# Altium schematic symbol library Regulator_Linear.SchLib: 1538 symbols (part 6 of 9) (continued)
## MCP1804x-1802xDB
designator *  value MCP1804x-1802xDB  Reference: U
ki_keywords: linear regulator ldo fixed positive; ki_description: 150mA, 28V LDO Regulator With Shutdown, 1.8V Fixed Output, SOT-223; ki_fp_filters: SOT?223*; Footprint: Package_TO_SOT_SMD:SOT-223-3_TabPin2; Datasheet: http://ww1.microchip.com/downloads/en/DeviceDoc/20002200D.pdf
pins: 1 OUT, 2 GND, 3 IN

## MCP1804x-1802xMB
designator *  value MCP1804x-1802xMB  Reference: U
ki_keywords: linear regulator ldo fixed positive; ki_description: 150mA, 28V LDO Regulator With Shutdown, 1.8V Fixed Output, SOT-89-3; ki_fp_filters: SOT?89*; Footprint: Package_TO_SOT_SMD:SOT-89-3; Datasheet: http://ww1.microchip.com/downloads/en/DeviceDoc/20002200D.pdf
pins: 1 OUT, 2 GND, 3 IN

## MCP1804x-1802xMT
designator *  value MCP1804x-1802xMT  Reference: U
ki_keywords: linear regulator ldo fixed positive; ki_description: 150mA, 28V LDO Regulator With Shutdown, 1.8V Fixed Output, SOT-89-5; ki_fp_filters: SOT?89*; Footprint: Package_TO_SOT_SMD:SOT-89-5; Datasheet: http://ww1.microchip.com/downloads/en/DeviceDoc/20002200D.pdf
pins: 1 VOUT, 2 GND, 3 ~{{SHDN}}, 4 NC hidden, 5 VIN

## MCP1804x-1802xOT
designator *  value MCP1804x-1802xOT  Reference: U
ki_keywords: linear regulator ldo fixed positive; ki_description: 150mA, 28V LDO Regulator With Shutdown, 1.8V Fixed Output, SOT-23-5; ki_fp_filters: SOT?23*; Footprint: Package_TO_SOT_SMD:SOT-23-5; Datasheet: http://ww1.microchip.com/downloads/en/DeviceDoc/20002200D.pdf
pins: 1 VIN, 2 GND, 3 NC hidden, 4 ~{{SHDN}}, 5 VOUT

## MCP1804x-2502xDB
designator *  value MCP1804x-2502xDB  Reference: U
ki_keywords: linear regulator ldo fixed positive; ki_description: 150mA, 28V LDO Regulator With Shutdown, 2.5V Fixed Output, SOT-223; ki_fp_filters: SOT?223*; Footprint: Package_TO_SOT_SMD:SOT-223-3_TabPin2; Datasheet: http://ww1.microchip.com/downloads/en/DeviceDoc/20002200D.pdf
pins: 1 OUT, 2 GND, 3 IN

## MCP1804x-2502xMB
designator *  value MCP1804x-2502xMB  Reference: U
ki_keywords: linear regulator ldo fixed positive; ki_description: 150mA, 28V LDO Regulator With Shutdown, 2.5V Fixed Output, SOT-89-3; ki_fp_filters: SOT?89*; Footprint: Package_TO_SOT_SMD:SOT-89-3; Datasheet: http://ww1.microchip.com/downloads/en/DeviceDoc/20002200D.pdf
pins: 1 OUT, 2 GND, 3 IN

## MCP1804x-2502xMT
designator *  value MCP1804x-2502xMT  Reference: U
ki_keywords: linear regulator ldo fixed positive; ki_description: 150mA, 28V LDO Regulator With Shutdown, 2.5V Fixed Output, SOT-89-5; ki_fp_filters: SOT?89*; Footprint: Package_TO_SOT_SMD:SOT-89-5; Datasheet: http://ww1.microchip.com/downloads/en/DeviceDoc/20002200D.pdf
pins: 1 VOUT, 2 GND, 3 ~{{SHDN}}, 4 NC hidden, 5 VIN

## MCP1804x-2502xOT
designator *  value MCP1804x-2502xOT  Reference: U
ki_keywords: linear regulator ldo fixed positive; ki_description: 150mA, 28V LDO Regulator With Shutdown, 2.5V Fixed Output, SOT-23-5; ki_fp_filters: SOT?23*; Footprint: Package_TO_SOT_SMD:SOT-23-5; Datasheet: http://ww1.microchip.com/downloads/en/DeviceDoc/20002200D.pdf
pins: 1 VIN, 2 GND, 3 NC hidden, 4 ~{{SHDN}}, 5 VOUT

## MCP1804x-3002xDB
designator *  value MCP1804x-3002xDB  Reference: U
ki_keywords: linear regulator ldo fixed positive; ki_description: 150mA, 28V LDO Regulator With Shutdown, 3.0V Fixed Output, SOT-223; ki_fp_filters: SOT?223*; Footprint: Package_TO_SOT_SMD:SOT-223-3_TabPin2; Datasheet: http://ww1.microchip.com/downloads/en/DeviceDoc/20002200D.pdf
pins: 1 OUT, 2 GND, 3 IN

## MCP1804x-3002xMB
designator *  value MCP1804x-3002xMB  Reference: U
ki_keywords: linear regulator ldo fixed positive; ki_description: 150mA, 28V LDO Regulator With Shutdown, 3.0V Fixed Output, SOT-89-3; ki_fp_filters: SOT?89*; Footprint: Package_TO_SOT_SMD:SOT-89-3; Datasheet: http://ww1.microchip.com/downloads/en/DeviceDoc/20002200D.pdf
pins: 1 OUT, 2 GND, 3 IN

## MCP1804x-3002xMT
designator *  value MCP1804x-3002xMT  Reference: U
ki_keywords: linear regulator ldo fixed positive; ki_description: 150mA, 28V LDO Regulator With Shutdown, 3.0V Fixed Output, SOT-89-5; ki_fp_filters: SOT?89*; Footprint: Package_TO_SOT_SMD:SOT-89-5; Datasheet: http://ww1.microchip.com/downloads/en/DeviceDoc/20002200D.pdf
pins: 1 VOUT, 2 GND, 3 ~{{SHDN}}, 4 NC hidden, 5 VIN

## MCP1804x-3002xOT
designator *  value MCP1804x-3002xOT  Reference: U
ki_keywords: linear regulator ldo fixed positive; ki_description: 150mA, 28V LDO Regulator With Shutdown, 3.0V Fixed Output, SOT-23-5; ki_fp_filters: SOT?23*; Footprint: Package_TO_SOT_SMD:SOT-23-5; Datasheet: http://ww1.microchip.com/downloads/en/DeviceDoc/20002200D.pdf
pins: 1 VIN, 2 GND, 3 NC hidden, 4 ~{{SHDN}}, 5 VOUT

## MCP1804x-3302xDB
designator *  value MCP1804x-3302xDB  Reference: U
ki_keywords: linear regulator ldo fixed positive; ki_description: 150mA, 28V LDO Regulator With Shutdown, 3.3V Fixed Output, SOT-223; ki_fp_filters: SOT?223*; Footprint: Package_TO_SOT_SMD:SOT-223-3_TabPin2; Datasheet: http://ww1.microchip.com/downloads/en/DeviceDoc/20002200D.pdf
pins: 1 OUT, 2 GND, 3 IN

## MCP1804x-3302xMB
designator *  value MCP1804x-3302xMB  Reference: U
ki_keywords: linear regulator ldo fixed positive; ki_description: 150mA, 28V LDO Regulator With Shutdown, 3.3V Fixed Output, SOT-89-3; ki_fp_filters: SOT?89*; Footprint: Package_TO_SOT_SMD:SOT-89-3; Datasheet: http://ww1.microchip.com/downloads/en/DeviceDoc/20002200D.pdf
pins: 1 OUT, 2 GND, 3 IN

## MCP1804x-3302xMT
designator *  value MCP1804x-3302xMT  Reference: U
ki_keywords: linear regulator ldo fixed positive; ki_description: 150mA, 28V LDO Regulator With Shutdown, 3.3V Fixed Output, SOT-89-5; ki_fp_filters: SOT?89*; Footprint: Package_TO_SOT_SMD:SOT-89-5; Datasheet: http://ww1.microchip.com/downloads/en/DeviceDoc/20002200D.pdf
pins: 1 VOUT, 2 GND, 3 ~{{SHDN}}, 4 NC hidden, 5 VIN

## MCP1804x-3302xOT
designator *  value MCP1804x-3302xOT  Reference: U
ki_keywords: linear regulator ldo fixed positive; ki_description: 150mA, 28V LDO Regulator With Shutdown, 3.3V Fixed Output, SOT-23-5; ki_fp_filters: SOT?23*; Footprint: Package_TO_SOT_SMD:SOT-23-5; Datasheet: http://ww1.microchip.com/downloads/en/DeviceDoc/20002200D.pdf
pins: 1 VIN, 2 GND, 3 NC hidden, 4 ~{{SHDN}}, 5 VOUT

## MCP1804x-5002xDB
designator *  value MCP1804x-5002xDB  Reference: U
ki_keywords: linear regulator ldo fixed positive; ki_description: 150mA, 28V LDO Regulator With Shutdown, 5.0V Fixed Output, SOT-223; ki_fp_filters: SOT?223*; Footprint: Package_TO_SOT_SMD:SOT-223-3_TabPin2; Datasheet: http://ww1.microchip.com/downloads/en/DeviceDoc/20002200D.pdf
pins: 1 OUT, 2 GND, 3 IN

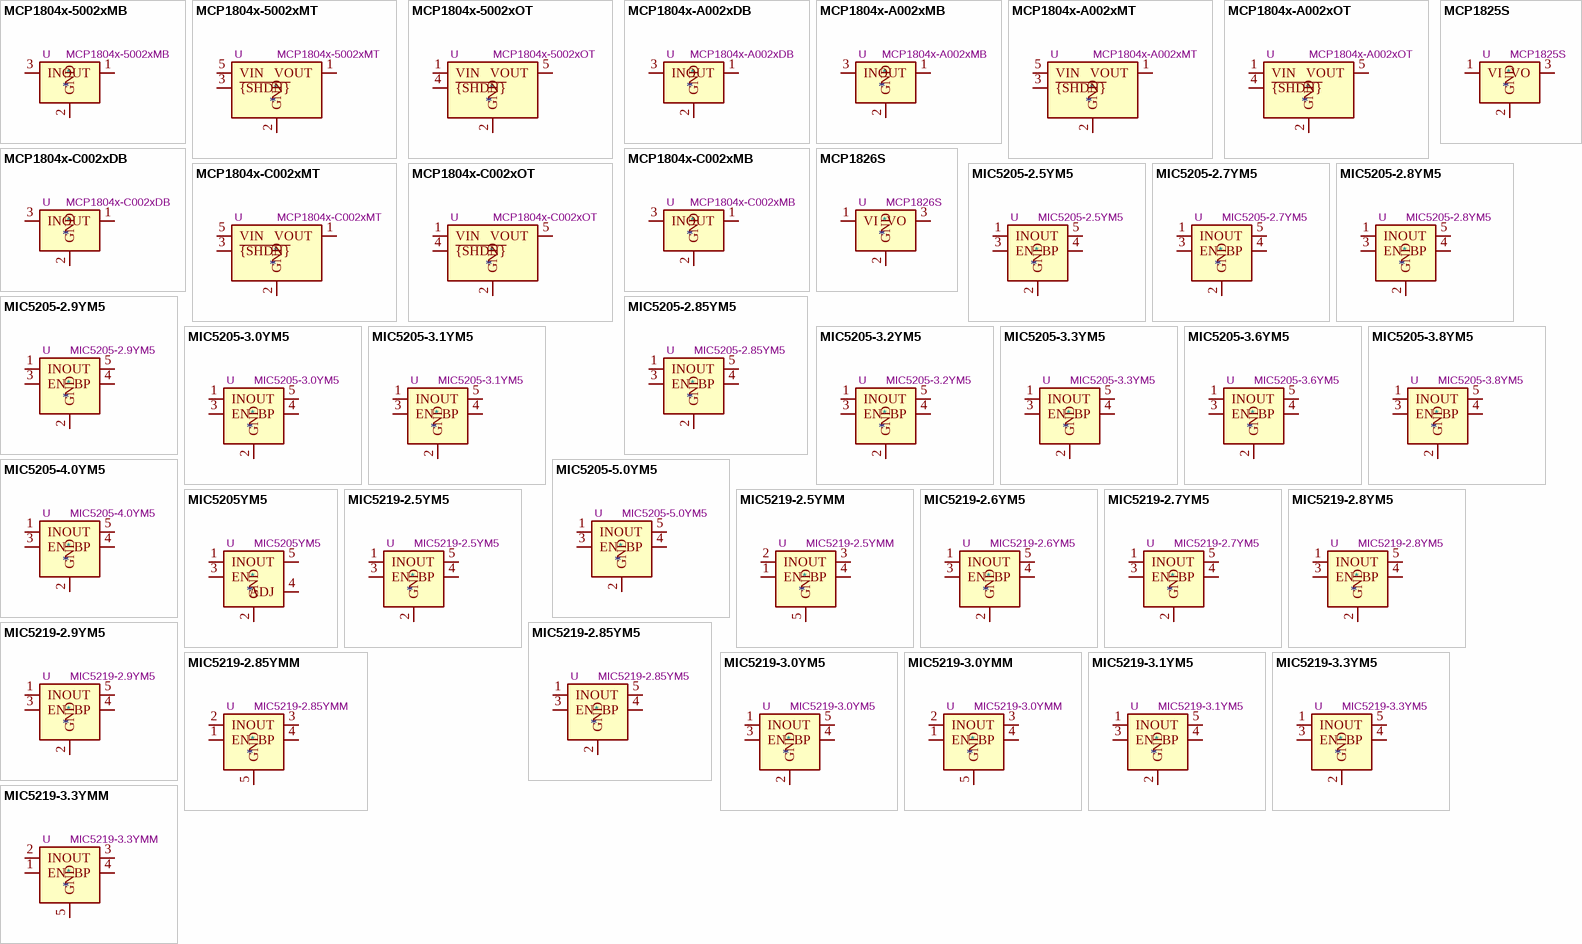
[diagram p25: symbols MCP1804x-5002xMB to MIC5219-3.3YMM]

## MCP1804x-5002xMB
designator *  value MCP1804x-5002xMB  Reference: U
ki_keywords: linear regulator ldo fixed positive; ki_description: 150mA, 28V LDO Regulator With Shutdown, 5.0V Fixed Output, SOT-89-3; ki_fp_filters: SOT?89*; Footprint: Package_TO_SOT_SMD:SOT-89-3; Datasheet: http://ww1.microchip.com/downloads/en/DeviceDoc/20002200D.pdf
pins: 1 OUT, 2 GND, 3 IN

## MCP1804x-5002xMT
designator *  value MCP1804x-5002xMT  Reference: U
ki_keywords: linear regulator ldo fixed positive; ki_description: 150mA, 28V LDO Regulator With Shutdown, 5.0V Fixed Output, SOT-89-5; ki_fp_filters: SOT?89*; Footprint: Package_TO_SOT_SMD:SOT-89-5; Datasheet: http://ww1.microchip.com/downloads/en/DeviceDoc/20002200D.pdf
pins: 1 VOUT, 2 GND, 3 ~{{SHDN}}, 4 NC hidden, 5 VIN

## MCP1804x-5002xOT
designator *  value MCP1804x-5002xOT  Reference: U
ki_keywords: linear regulator ldo fixed positive; ki_description: 150mA, 28V LDO Regulator With Shutdown, 5.0V Fixed Output, SOT-23-5; ki_fp_filters: SOT?23*; Footprint: Package_TO_SOT_SMD:SOT-23-5; Datasheet: http://ww1.microchip.com/downloads/en/DeviceDoc/20002200D.pdf
pins: 1 VIN, 2 GND, 3 NC hidden, 4 ~{{SHDN}}, 5 VOUT

## MCP1804x-A002xDB
designator *  value MCP1804x-A002xDB  Reference: U
ki_keywords: linear regulator ldo fixed positive; ki_description: 150mA, 28V LDO Regulator With Shutdown, 10.0V Fixed Output, SOT-223; ki_fp_filters: SOT?223*; Footprint: Package_TO_SOT_SMD:SOT-223-3_TabPin2; Datasheet: http://ww1.microchip.com/downloads/en/DeviceDoc/20002200D.pdf
pins: 1 OUT, 2 GND, 3 IN

## MCP1804x-A002xMB
designator *  value MCP1804x-A002xMB  Reference: U
ki_keywords: linear regulator ldo fixed positive; ki_description: 150mA, 28V LDO Regulator With Shutdown, 10.0V Fixed Output, SOT-89-3; ki_fp_filters: SOT?89*; Footprint: Package_TO_SOT_SMD:SOT-89-3; Datasheet: http://ww1.microchip.com/downloads/en/DeviceDoc/20002200D.pdf
pins: 1 OUT, 2 GND, 3 IN

## MCP1804x-A002xMT
designator *  value MCP1804x-A002xMT  Reference: U
ki_keywords: linear regulator ldo fixed positive; ki_description: 150mA, 28V LDO Regulator With Shutdown, 10.0V Fixed Output, SOT-89-5; ki_fp_filters: SOT?89*; Footprint: Package_TO_SOT_SMD:SOT-89-5; Datasheet: http://ww1.microchip.com/downloads/en/DeviceDoc/20002200D.pdf
pins: 1 VOUT, 2 GND, 3 ~{{SHDN}}, 4 NC hidden, 5 VIN

## MCP1804x-A002xOT
designator *  value MCP1804x-A002xOT  Reference: U
ki_keywords: linear regulator ldo fixed positive; ki_description: 150mA, 28V LDO Regulator With Shutdown, 10.0V Fixed Output, SOT-23-5; ki_fp_filters: SOT?23*; Footprint: Package_TO_SOT_SMD:SOT-23-5; Datasheet: http://ww1.microchip.com/downloads/en/DeviceDoc/20002200D.pdf
pins: 1 VIN, 2 GND, 3 NC hidden, 4 ~{{SHDN}}, 5 VOUT

## MCP1804x-C002xDB
designator *  value MCP1804x-C002xDB  Reference: U
ki_keywords: linear regulator ldo fixed positive; ki_description: 150mA, 28V LDO Regulator With Shutdown, 12.0V Fixed Output, SOT-223; ki_fp_filters: SOT?223*; Footprint: Package_TO_SOT_SMD:SOT-223-3_TabPin2; Datasheet: http://ww1.microchip.com/downloads/en/DeviceDoc/20002200D.pdf
pins: 1 OUT, 2 GND, 3 IN

## MCP1804x-C002xMB
designator *  value MCP1804x-C002xMB  Reference: U
ki_keywords: linear regulator ldo fixed positive; ki_description: 150mA, 28V LDO Regulator With Shutdown, 12.0V Fixed Output, SOT-89-3; ki_fp_filters: SOT?89*; Footprint: Package_TO_SOT_SMD:SOT-89-3; Datasheet: http://ww1.microchip.com/downloads/en/DeviceDoc/20002200D.pdf
pins: 1 OUT, 2 GND, 3 IN

## MCP1804x-C002xMT
designator *  value MCP1804x-C002xMT  Reference: U
ki_keywords: linear regulator ldo fixed positive; ki_description: 150mA, 28V LDO Regulator With Shutdown, 12.0V Fixed Output, SOT-89-5; ki_fp_filters: SOT?89*; Footprint: Package_TO_SOT_SMD:SOT-89-5; Datasheet: http://ww1.microchip.com/downloads/en/DeviceDoc/20002200D.pdf
pins: 1 VOUT, 2 GND, 3 ~{{SHDN}}, 4 NC hidden, 5 VIN

## MCP1804x-C002xOT
designator *  value MCP1804x-C002xOT  Reference: U
ki_keywords: linear regulator ldo fixed positive; ki_description: 150mA, 28V LDO Regulator With Shutdown, 12.0V Fixed Output, SOT-23-5; ki_fp_filters: SOT?23*; Footprint: Package_TO_SOT_SMD:SOT-23-5; Datasheet: http://ww1.microchip.com/downloads/en/DeviceDoc/20002200D.pdf
pins: 1 VIN, 2 GND, 3 NC hidden, 4 ~{{SHDN}}, 5 VOUT

## MCP1825S
designator *  value MCP1825S  Reference: U
ki_keywords: regulator linear ldo; ki_description: 500mA, Low-Voltage, Low Quiescent Current LDO Regulator, SOT-223, TO-220, TO-263; ki_fp_filters: SOT?223*TabPin2* TO?220* TO?263*; Datasheet: http://ww1.microchip.com/downloads/en/devicedoc/22056b.pdf
pins: 1 VI, 2 GND, 3 VO

## MCP1826S
designator *  value MCP1826S  Reference: U
ki_keywords: regulator linear ldo; ki_description: 1000mA, Low-Voltage, Low Quiescent Current LDO Regulator, SOT-223, TO-220, TO-263; ki_fp_filters: SOT?223*TabPin2* TO?220* TO?263*; Datasheet: http://ww1.microchip.com/downloads/en/DeviceDoc/22057B.pdf
pins: 1 VI, 2 GND, 3 VO

## MIC5205-2.5YM5
designator *  value MIC5205-2.5YM5  Reference: U
ki_keywords: 150mA low-noise LDO linear voltage regulator fixed positive; ki_description: 150mA low dropout linear regulator, fixed 2.5V output, SOT-23-5; ki_fp_filters: SOT?23*; Footprint: Package_TO_SOT_SMD:SOT-23-5; Datasheet: http://ww1.microchip.com/downloads/en/DeviceDoc/20005785A.pdf
pins: 1 IN, 2 GND, 3 EN, 4 BP, 5 OUT

## MIC5205-2.7YM5
designator *  value MIC5205-2.7YM5  Reference: U
ki_keywords: 150mA low-noise LDO linear voltage regulator fixed positive; ki_description: 150mA low dropout linear regulator, fixed 2.7V output, SOT-23-5; ki_fp_filters: SOT?23*; Footprint: Package_TO_SOT_SMD:SOT-23-5; Datasheet: http://ww1.microchip.com/downloads/en/DeviceDoc/20005785A.pdf
pins: 1 IN, 2 GND, 3 EN, 4 BP, 5 OUT

## MIC5205-2.8YM5
designator *  value MIC5205-2.8YM5  Reference: U
ki_keywords: 150mA low-noise LDO linear voltage regulator fixed positive; ki_description: 150mA low dropout linear regulator, fixed 2.8V output, SOT-23-5; ki_fp_filters: SOT?23*; Footprint: Package_TO_SOT_SMD:SOT-23-5; Datasheet: http://ww1.microchip.com/downloads/en/DeviceDoc/20005785A.pdf
pins: 1 IN, 2 GND, 3 EN, 4 BP, 5 OUT

## MIC5205-2.9YM5
designator *  value MIC5205-2.9YM5  Reference: U
ki_keywords: 150mA low-noise LDO linear voltage regulator fixed positive; ki_description: 150mA low dropout linear regulator, fixed 2.9V output, SOT-23-5; ki_fp_filters: SOT?23*; Footprint: Package_TO_SOT_SMD:SOT-23-5; Datasheet: http://ww1.microchip.com/downloads/en/DeviceDoc/20005785A.pdf
pins: 1 IN, 2 GND, 3 EN, 4 BP, 5 OUT

## MIC5205-2.85YM5
designator *  value MIC5205-2.85YM5  Reference: U
ki_keywords: 150mA low-noise LDO linear voltage regulator fixed positive; ki_description: 150mA low dropout linear regulator, fixed 2.85V output, SOT-23-5; ki_fp_filters: SOT?23*; Footprint: Package_TO_SOT_SMD:SOT-23-5; Datasheet: http://ww1.microchip.com/downloads/en/DeviceDoc/20005785A.pdf
pins: 1 IN, 2 GND, 3 EN, 4 BP, 5 OUT

## MIC5205-3.0YM5
designator *  value MIC5205-3.0YM5  Reference: U
ki_keywords: 150mA low-noise LDO linear voltage regulator fixed positive; ki_description: 150mA low dropout linear regulator, fixed 3.0V output, SOT-23-5; ki_fp_filters: SOT?23*; Footprint: Package_TO_SOT_SMD:SOT-23-5; Datasheet: http://ww1.microchip.com/downloads/en/DeviceDoc/20005785A.pdf
pins: 1 IN, 2 GND, 3 EN, 4 BP, 5 OUT

## MIC5205-3.1YM5
designator *  value MIC5205-3.1YM5  Reference: U
ki_keywords: 150mA low-noise LDO linear voltage regulator fixed positive; ki_description: 150mA low dropout linear regulator, fixed 3.1V output, SOT-23-5; ki_fp_filters: SOT?23*; Footprint: Package_TO_SOT_SMD:SOT-23-5; Datasheet: http://ww1.microchip.com/downloads/en/DeviceDoc/20005785A.pdf
pins: 1 IN, 2 GND, 3 EN, 4 BP, 5 OUT

## MIC5205-3.2YM5
designator *  value MIC5205-3.2YM5  Reference: U
ki_keywords: 150mA low-noise LDO linear voltage regulator fixed positive; ki_description: 150mA low dropout linear regulator, fixed 3.2V output, SOT-23-5; ki_fp_filters: SOT?23*; Footprint: Package_TO_SOT_SMD:SOT-23-5; Datasheet: http://ww1.microchip.com/downloads/en/DeviceDoc/20005785A.pdf
pins: 1 IN, 2 GND, 3 EN, 4 BP, 5 OUT

## MIC5205-3.3YM5
designator *  value MIC5205-3.3YM5  Reference: U
ki_keywords: 150mA low-noise LDO linear voltage regulator fixed positive; ki_description: 150mA low dropout linear regulator, fixed 3.3V output, SOT-23-5; ki_fp_filters: SOT?23*; Footprint: Package_TO_SOT_SMD:SOT-23-5; Datasheet: http://ww1.microchip.com/downloads/en/DeviceDoc/20005785A.pdf
pins: 1 IN, 2 GND, 3 EN, 4 BP, 5 OUT

## MIC5205-3.6YM5
designator *  value MIC5205-3.6YM5  Reference: U
ki_keywords: 150mA low-noise LDO linear voltage regulator fixed positive; ki_description: 150mA low dropout linear regulator, fixed 3.6V output, SOT-23-5; ki_fp_filters: SOT?23*; Footprint: Package_TO_SOT_SMD:SOT-23-5; Datasheet: http://ww1.microchip.com/downloads/en/DeviceDoc/20005785A.pdf
pins: 1 IN, 2 GND, 3 EN, 4 BP, 5 OUT

## MIC5205-3.8YM5
designator *  value MIC5205-3.8YM5  Reference: U
ki_keywords: 150mA low-noise LDO linear voltage regulator fixed positive; ki_description: 150mA low dropout linear regulator, fixed 3.8V output, SOT-23-5; ki_fp_filters: SOT?23*; Footprint: Package_TO_SOT_SMD:SOT-23-5; Datasheet: http://ww1.microchip.com/downloads/en/DeviceDoc/20005785A.pdf
pins: 1 IN, 2 GND, 3 EN, 4 BP, 5 OUT

## MIC5205-4.0YM5
designator *  value MIC5205-4.0YM5  Reference: U
ki_keywords: 150mA low-noise LDO linear voltage regulator fixed positive; ki_description: 150mA low dropout linear regulator, fixed 4.0V output, SOT-23-5; ki_fp_filters: SOT?23*; Footprint: Package_TO_SOT_SMD:SOT-23-5; Datasheet: http://ww1.microchip.com/downloads/en/DeviceDoc/20005785A.pdf
pins: 1 IN, 2 GND, 3 EN, 4 BP, 5 OUT

## MIC5205-5.0YM5
designator *  value MIC5205-5.0YM5  Reference: U
ki_keywords: 150mA low-noise LDO linear voltage regulator fixed positive; ki_description: 150mA low dropout linear regulator, fixed 5.0V output, SOT-23-5; ki_fp_filters: SOT?23*; Footprint: Package_TO_SOT_SMD:SOT-23-5; Datasheet: http://ww1.microchip.com/downloads/en/DeviceDoc/20005785A.pdf
pins: 1 IN, 2 GND, 3 EN, 4 BP, 5 OUT

## MIC5205YM5
designator *  value MIC5205YM5  Reference: U
ki_keywords: 150mA low-noise LDO linear voltage regulator adjustable positive; ki_description: 150mA low dropout linear regulator, adjustable output, SOT-23-5; ki_fp_filters: SOT?23*; Footprint: Package_TO_SOT_SMD:SOT-23-5; Datasheet: http://ww1.microchip.com/downloads/en/DeviceDoc/20005785A.pdf
pins: 1 IN, 2 GND, 3 EN, 4 ADJ, 5 OUT

## MIC5219-2.5YM5
designator *  value MIC5219-2.5YM5  Reference: U
ki_keywords: 500mA ultra-low-noise LDO linear voltage regulator fixed positive; ki_description: 500mA low dropout linear regulator, fixed 2.5V output, SOT-23-5; ki_fp_filters: SOT?23*; Footprint: Package_TO_SOT_SMD:SOT-23-5; Datasheet: http://ww1.microchip.com/downloads/en/DeviceDoc/MIC5219-500mA-Peak-Output-LDO-Regulator-DS20006021A.pdf
pins: 1 IN, 2 GND, 3 EN, 4 BP, 5 OUT

## MIC5219-2.5YMM
designator *  value MIC5219-2.5YMM  Reference: U
ki_keywords: 500mA ultra-low-noise LDO linear voltage regulator fixed positive; ki_description: 500mA low dropout linear regulator, fixed 2.5V output, MSOP-8; ki_fp_filters: MSOP*3x3mm*P0.65mm*; Footprint: Package_SO:MSOP-8_3x3mm_P0.65mm; Datasheet: http://ww1.microchip.com/downloads/en/DeviceDoc/MIC5219-500mA-Peak-Output-LDO-Regulator-DS20006021A.pdf
pins: 1 EN, 2 IN, 3 OUT, 4 BP, 5 GND, 6 GND hidden, 7 GND hidden, 8 GND hidden

## MIC5219-2.6YM5
designator *  value MIC5219-2.6YM5  Reference: U
ki_keywords: 500mA ultra-low-noise LDO linear voltage regulator fixed positive; ki_description: 500mA low dropout linear regulator, fixed 2.6V output, SOT-23-5; ki_fp_filters: SOT?23*; Footprint: Package_TO_SOT_SMD:SOT-23-5; Datasheet: http://ww1.microchip.com/downloads/en/DeviceDoc/MIC5219-500mA-Peak-Output-LDO-Regulator-DS20006021A.pdf
pins: 1 IN, 2 GND, 3 EN, 4 BP, 5 OUT

## MIC5219-2.7YM5
designator *  value MIC5219-2.7YM5  Reference: U
ki_keywords: 500mA ultra-low-noise LDO linear voltage regulator fixed positive; ki_description: 500mA low dropout linear regulator, fixed 2.7V output, SOT-23-5; ki_fp_filters: SOT?23*; Footprint: Package_TO_SOT_SMD:SOT-23-5; Datasheet: http://ww1.microchip.com/downloads/en/DeviceDoc/MIC5219-500mA-Peak-Output-LDO-Regulator-DS20006021A.pdf
pins: 1 IN, 2 GND, 3 EN, 4 BP, 5 OUT

## MIC5219-2.8YM5
designator *  value MIC5219-2.8YM5  Reference: U
ki_keywords: 500mA ultra-low-noise LDO linear voltage regulator fixed positive; ki_description: 500mA low dropout linear regulator, fixed 2.8V output, SOT-23-5; ki_fp_filters: SOT?23*; Footprint: Package_TO_SOT_SMD:SOT-23-5; Datasheet: http://ww1.microchip.com/downloads/en/DeviceDoc/MIC5219-500mA-Peak-Output-LDO-Regulator-DS20006021A.pdf
pins: 1 IN, 2 GND, 3 EN, 4 BP, 5 OUT

## MIC5219-2.9YM5
designator *  value MIC5219-2.9YM5  Reference: U
ki_keywords: 500mA ultra-low-noise LDO linear voltage regulator fixed positive; ki_description: 500mA low dropout linear regulator, fixed 2.9V output, SOT-23-5; ki_fp_filters: SOT?23*; Footprint: Package_TO_SOT_SMD:SOT-23-5; Datasheet: http://ww1.microchip.com/downloads/en/DeviceDoc/MIC5219-500mA-Peak-Output-LDO-Regulator-DS20006021A.pdf
pins: 1 IN, 2 GND, 3 EN, 4 BP, 5 OUT

## MIC5219-2.85YM5
designator *  value MIC5219-2.85YM5  Reference: U
ki_keywords: 500mA ultra-low-noise LDO linear voltage regulator fixed positive; ki_description: 500mA low dropout linear regulator, fixed 2.85V output, SOT-23-5; ki_fp_filters: SOT?23*; Footprint: Package_TO_SOT_SMD:SOT-23-5; Datasheet: http://ww1.microchip.com/downloads/en/DeviceDoc/MIC5219-500mA-Peak-Output-LDO-Regulator-DS20006021A.pdf
pins: 1 IN, 2 GND, 3 EN, 4 BP, 5 OUT

## MIC5219-2.85YMM
designator *  value MIC5219-2.85YMM  Reference: U
ki_keywords: 500mA ultra-low-noise LDO linear voltage regulator fixed positive; ki_description: 500mA low dropout linear regulator, fixed 2.85V output, MSOP-8; ki_fp_filters: MSOP*3x3mm*P0.65mm*; Footprint: Package_SO:MSOP-8_3x3mm_P0.65mm; Datasheet: http://ww1.microchip.com/downloads/en/DeviceDoc/MIC5219-500mA-Peak-Output-LDO-Regulator-DS20006021A.pdf
pins: 1 EN, 2 IN, 3 OUT, 4 BP, 5 GND, 6 GND hidden, 7 GND hidden, 8 GND hidden

## MIC5219-3.0YM5
designator *  value MIC5219-3.0YM5  Reference: U
ki_keywords: 500mA ultra-low-noise LDO linear voltage regulator fixed positive; ki_description: 500mA low dropout linear regulator, fixed 3.0V output, SOT-23-5; ki_fp_filters: SOT?23*; Footprint: Package_TO_SOT_SMD:SOT-23-5; Datasheet: http://ww1.microchip.com/downloads/en/DeviceDoc/MIC5219-500mA-Peak-Output-LDO-Regulator-DS20006021A.pdf
pins: 1 IN, 2 GND, 3 EN, 4 BP, 5 OUT

## MIC5219-3.0YMM
designator *  value MIC5219-3.0YMM  Reference: U
ki_keywords: 500mA ultra-low-noise LDO linear voltage regulator fixed positive; ki_description: 500mA low dropout linear regulator, fixed 3.0V output, MSOP-8; ki_fp_filters: MSOP*3x3mm*P0.65mm*; Footprint: Package_SO:MSOP-8_3x3mm_P0.65mm; Datasheet: http://ww1.microchip.com/downloads/en/DeviceDoc/MIC5219-500mA-Peak-Output-LDO-Regulator-DS20006021A.pdf
pins: 1 EN, 2 IN, 3 OUT, 4 BP, 5 GND, 6 GND hidden, 7 GND hidden, 8 GND hidden

## MIC5219-3.1YM5
designator *  value MIC5219-3.1YM5  Reference: U
ki_keywords: 500mA ultra-low-noise LDO linear voltage regulator fixed positive; ki_description: 500mA low dropout linear regulator, fixed 3.1V output, SOT-23-5; ki_fp_filters: SOT?23*; Footprint: Package_TO_SOT_SMD:SOT-23-5; Datasheet: http://ww1.microchip.com/downloads/en/DeviceDoc/MIC5219-500mA-Peak-Output-LDO-Regulator-DS20006021A.pdf
pins: 1 IN, 2 GND, 3 EN, 4 BP, 5 OUT

## MIC5219-3.3YM5
designator *  value MIC5219-3.3YM5  Reference: U
ki_keywords: 500mA ultra-low-noise LDO linear voltage regulator fixed positive; ki_description: 500mA low dropout linear regulator, fixed 3.3V output, SOT-23-5; ki_fp_filters: SOT?23*; Footprint: Package_TO_SOT_SMD:SOT-23-5; Datasheet: http://ww1.microchip.com/downloads/en/DeviceDoc/MIC5219-500mA-Peak-Output-LDO-Regulator-DS20006021A.pdf
pins: 1 IN, 2 GND, 3 EN, 4 BP, 5 OUT

## MIC5219-3.3YMM
designator *  value MIC5219-3.3YMM  Reference: U
ki_keywords: 500mA ultra-low-noise LDO linear voltage regulator fixed positive; ki_description: 500mA low dropout linear regulator, fixed 3.3V output, MSOP-8; ki_fp_filters: MSOP*3x3mm*P0.65mm*; Footprint: Package_SO:MSOP-8_3x3mm_P0.65mm; Datasheet: http://ww1.microchip.com/downloads/en/DeviceDoc/MIC5219-500mA-Peak-Output-LDO-Regulator-DS20006021A.pdf
pins: 1 EN, 2 IN, 3 OUT, 4 BP, 5 GND, 6 GND hidden, 7 GND hidden, 8 GND hidden

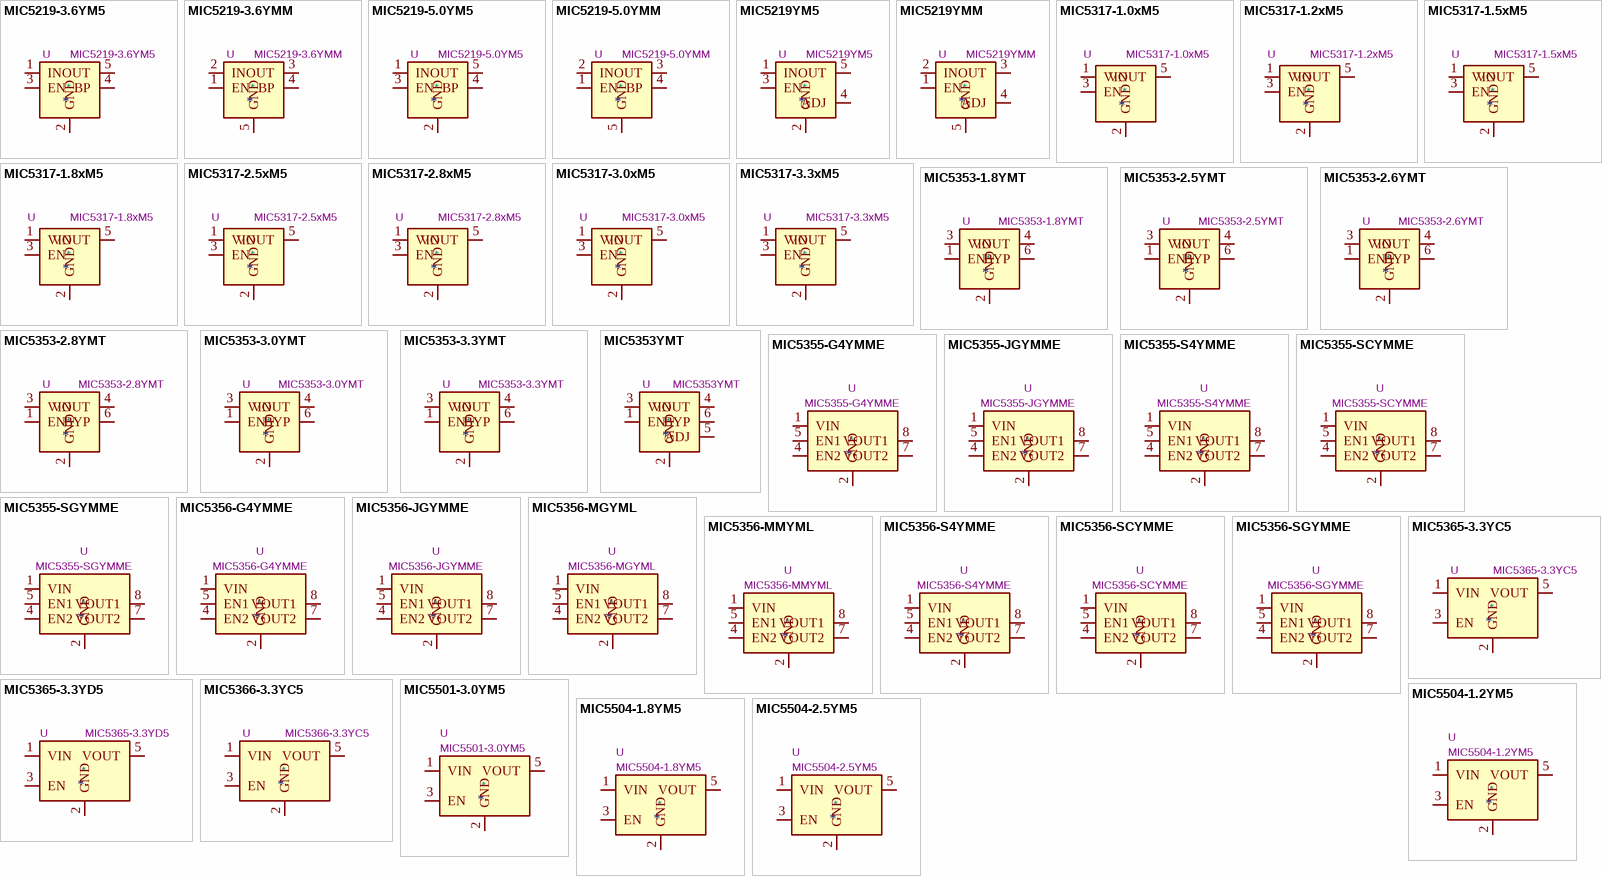
[diagram p26: symbols MIC5219-3.6YM5 to MIC5504-2.5YM5]

## MIC5219-3.6YM5
designator *  value MIC5219-3.6YM5  Reference: U
ki_keywords: 500mA ultra-low-noise LDO linear voltage regulator fixed positive; ki_description: 500mA low dropout linear regulator, fixed 3.6V output, SOT-23-5; ki_fp_filters: SOT?23*; Footprint: Package_TO_SOT_SMD:SOT-23-5; Datasheet: http://ww1.microchip.com/downloads/en/DeviceDoc/MIC5219-500mA-Peak-Output-LDO-Regulator-DS20006021A.pdf
pins: 1 IN, 2 GND, 3 EN, 4 BP, 5 OUT

## MIC5219-3.6YMM
designator *  value MIC5219-3.6YMM  Reference: U
ki_keywords: 500mA ultra-low-noise LDO linear voltage regulator fixed positive; ki_description: 500mA low dropout linear regulator, fixed 3.6V output, MSOP-8; ki_fp_filters: MSOP*3x3mm*P0.65mm*; Footprint: Package_SO:MSOP-8_3x3mm_P0.65mm; Datasheet: http://ww1.microchip.com/downloads/en/DeviceDoc/MIC5219-500mA-Peak-Output-LDO-Regulator-DS20006021A.pdf
pins: 1 EN, 2 IN, 3 OUT, 4 BP, 5 GND, 6 GND hidden, 7 GND hidden, 8 GND hidden

## MIC5219-5.0YM5
designator *  value MIC5219-5.0YM5  Reference: U
ki_keywords: 500mA ultra-low-noise LDO linear voltage regulator fixed positive; ki_description: 500mA low dropout linear regulator, fixed 5.0V output, SOT-23-5; ki_fp_filters: SOT?23*; Footprint: Package_TO_SOT_SMD:SOT-23-5; Datasheet: http://ww1.microchip.com/downloads/en/DeviceDoc/MIC5219-500mA-Peak-Output-LDO-Regulator-DS20006021A.pdf
pins: 1 IN, 2 GND, 3 EN, 4 BP, 5 OUT

## MIC5219-5.0YMM
designator *  value MIC5219-5.0YMM  Reference: U
ki_keywords: 500mA ultra-low-noise LDO linear voltage regulator fixed positive; ki_description: 500mA low dropout linear regulator, fixed 5.0V output, MSOP-8; ki_fp_filters: MSOP*3x3mm*P0.65mm*; Footprint: Package_SO:MSOP-8_3x3mm_P0.65mm; Datasheet: http://ww1.microchip.com/downloads/en/DeviceDoc/MIC5219-500mA-Peak-Output-LDO-Regulator-DS20006021A.pdf
pins: 1 EN, 2 IN, 3 OUT, 4 BP, 5 GND, 6 GND hidden, 7 GND hidden, 8 GND hidden

## MIC5219YM5
designator *  value MIC5219YM5  Reference: U
ki_keywords: 500mA ultra-low-noise LDO linear voltage regulator adjustable positive; ki_description: 500mA low dropout linear regulator, adjustable output, SOT-23-5; ki_fp_filters: SOT?23*; Footprint: Package_TO_SOT_SMD:SOT-23-5; Datasheet: http://ww1.microchip.com/downloads/en/DeviceDoc/MIC5219-500mA-Peak-Output-LDO-Regulator-DS20006021A.pdf
pins: 1 IN, 2 GND, 3 EN, 4 ADJ, 5 OUT

## MIC5219YMM
designator *  value MIC5219YMM  Reference: U
ki_keywords: 500mA ultra-low-noise LDO linear voltage regulator adjustable positive; ki_description: 500mA low dropout linear regulator, adjustable output, MSOP-8; ki_fp_filters: MSOP*3x3mm*P0.65mm*; Footprint: Package_SO:MSOP-8_3x3mm_P0.65mm; Datasheet: http://ww1.microchip.com/downloads/en/DeviceDoc/MIC5219-500mA-Peak-Output-LDO-Regulator-DS20006021A.pdf
pins: 1 EN, 2 IN, 3 OUT, 4 ADJ, 5 GND, 6 GND hidden, 7 GND hidden, 8 GND hidden

## MIC5317-1.0xM5
designator *  value MIC5317-1.0xM5  Reference: U
ki_keywords: LDO voltage regulator; ki_description: 150mA Low-dropout Voltage Regulator, Vout 1.0V, Vin up to 6V, SOT23-5; ki_fp_filters: SOT?23*; Footprint: Package_TO_SOT_SMD:SOT-23-5; Datasheet: https://ww1.microchip.com/downloads/aemDocuments/documents/OTH/ProductDocuments/DataSheets/MIC5317-High-Performance-Single-150mA-LDO-DS20006195B.pdf
pins: 1 VIN, 2 GND, 3 EN, 4 NC hidden, 5 VOUT

## MIC5317-1.2xM5
designator *  value MIC5317-1.2xM5  Reference: U
ki_keywords: LDO voltage regulator; ki_description: 150mA Low-dropout Voltage Regulator, Vout 1.2V, Vin up to 6V, SOT23-5; ki_fp_filters: SOT?23*; Footprint: Package_TO_SOT_SMD:SOT-23-5; Datasheet: https://ww1.microchip.com/downloads/aemDocuments/documents/OTH/ProductDocuments/DataSheets/MIC5317-High-Performance-Single-150mA-LDO-DS20006195B.pdf
pins: 1 VIN, 2 GND, 3 EN, 4 NC hidden, 5 VOUT

## MIC5317-1.5xM5
designator *  value MIC5317-1.5xM5  Reference: U
ki_keywords: LDO voltage regulator; ki_description: 150mA Low-dropout Voltage Regulator, Vout 1.5V, Vin up to 6V, SOT23-5; ki_fp_filters: SOT?23*; Footprint: Package_TO_SOT_SMD:SOT-23-5; Datasheet: https://ww1.microchip.com/downloads/aemDocuments/documents/OTH/ProductDocuments/DataSheets/MIC5317-High-Performance-Single-150mA-LDO-DS20006195B.pdf
pins: 1 VIN, 2 GND, 3 EN, 4 NC hidden, 5 VOUT

## MIC5317-1.8xM5
designator *  value MIC5317-1.8xM5  Reference: U
ki_keywords: LDO voltage regulator; ki_description: 150mA Low-dropout Voltage Regulator, Vout 1.8V, Vin up to 6V, SOT23-5; ki_fp_filters: SOT?23*; Footprint: Package_TO_SOT_SMD:SOT-23-5; Datasheet: https://ww1.microchip.com/downloads/aemDocuments/documents/OTH/ProductDocuments/DataSheets/MIC5317-High-Performance-Single-150mA-LDO-DS20006195B.pdf
pins: 1 VIN, 2 GND, 3 EN, 4 NC hidden, 5 VOUT

## MIC5317-2.5xM5
designator *  value MIC5317-2.5xM5  Reference: U
ki_keywords: LDO voltage regulator; ki_description: 150mA Low-dropout Voltage Regulator, Vout 2.5V, Vin up to 6V, SOT23-5; ki_fp_filters: SOT?23*; Footprint: Package_TO_SOT_SMD:SOT-23-5; Datasheet: https://ww1.microchip.com/downloads/aemDocuments/documents/OTH/ProductDocuments/DataSheets/MIC5317-High-Performance-Single-150mA-LDO-DS20006195B.pdf
pins: 1 VIN, 2 GND, 3 EN, 4 NC hidden, 5 VOUT

## MIC5317-2.8xM5
designator *  value MIC5317-2.8xM5  Reference: U
ki_keywords: LDO voltage regulator; ki_description: 150mA Low-dropout Voltage Regulator, Vout 2.8V, Vin up to 6V, SOT23-5; ki_fp_filters: SOT?23*; Footprint: Package_TO_SOT_SMD:SOT-23-5; Datasheet: https://ww1.microchip.com/downloads/aemDocuments/documents/OTH/ProductDocuments/DataSheets/MIC5317-High-Performance-Single-150mA-LDO-DS20006195B.pdf
pins: 1 VIN, 2 GND, 3 EN, 4 NC hidden, 5 VOUT

## MIC5317-3.0xM5
designator *  value MIC5317-3.0xM5  Reference: U
ki_keywords: LDO voltage regulator; ki_description: 150mA Low-dropout Voltage Regulator, Vout 3.0V, Vin up to 6V, SOT23-5; ki_fp_filters: SOT?23*; Footprint: Package_TO_SOT_SMD:SOT-23-5; Datasheet: https://ww1.microchip.com/downloads/aemDocuments/documents/OTH/ProductDocuments/DataSheets/MIC5317-High-Performance-Single-150mA-LDO-DS20006195B.pdf
pins: 1 VIN, 2 GND, 3 EN, 4 NC hidden, 5 VOUT

## MIC5317-3.3xM5
designator *  value MIC5317-3.3xM5  Reference: U
ki_keywords: LDO voltage regulator; ki_description: 150mA Low-dropout Voltage Regulator, Vout 3.3V, Vin up to 6V, SOT23-5; ki_fp_filters: SOT?23*; Footprint: Package_TO_SOT_SMD:SOT-23-5; Datasheet: https://ww1.microchip.com/downloads/aemDocuments/documents/OTH/ProductDocuments/DataSheets/MIC5317-High-Performance-Single-150mA-LDO-DS20006195B.pdf
pins: 1 VIN, 2 GND, 3 EN, 4 NC hidden, 5 VOUT

## MIC5353-1.8YMT
designator *  value MIC5353-1.8YMT  Reference: U
ki_keywords: Single LDO; ki_description: High-performance, single-output,  ultra-low  LDO regulator; ki_fp_filters: MLF?6?1EP*1.6x1.6mm*P0.5mm*; Footprint: Package_DFN_QFN:MLF-6-1EP_1.6x1.6mm_P0.5mm_EP0.5x1.26mm; Datasheet: http://ww1.microchip.com/downloads/en/DeviceDoc/mic5353.pdf
pins: 1 EN, 2 GND, 3 VIN, 4 VOUT, 5 NC hidden, 6 BYP, 7 GND hidden

## MIC5353-2.5YMT
designator *  value MIC5353-2.5YMT  Reference: U
ki_keywords: Single LDO; ki_description: High-performance, single-output,  ultra-low  LDO regulator; ki_fp_filters: MLF?6?1EP*1.6x1.6mm*P0.5mm*; Footprint: Package_DFN_QFN:MLF-6-1EP_1.6x1.6mm_P0.5mm_EP0.5x1.26mm; Datasheet: http://ww1.microchip.com/downloads/en/DeviceDoc/mic5353.pdf
pins: 1 EN, 2 GND, 3 VIN, 4 VOUT, 5 NC hidden, 6 BYP, 7 GND hidden

## MIC5353-2.6YMT
designator *  value MIC5353-2.6YMT  Reference: U
ki_keywords: Single LDO; ki_description: High-performance, single-output,  ultra-low  LDO regulator; ki_fp_filters: MLF?6?1EP*1.6x1.6mm*P0.5mm*; Footprint: Package_DFN_QFN:MLF-6-1EP_1.6x1.6mm_P0.5mm_EP0.5x1.26mm; Datasheet: http://ww1.microchip.com/downloads/en/DeviceDoc/mic5353.pdf
pins: 1 EN, 2 GND, 3 VIN, 4 VOUT, 5 NC hidden, 6 BYP, 7 GND hidden

## MIC5353-2.8YMT
designator *  value MIC5353-2.8YMT  Reference: U
ki_keywords: Single LDO; ki_description: High-performance, single-output,  ultra-low  LDO regulator; ki_fp_filters: MLF?6?1EP*1.6x1.6mm*P0.5mm*; Footprint: Package_DFN_QFN:MLF-6-1EP_1.6x1.6mm_P0.5mm_EP0.5x1.26mm; Datasheet: http://ww1.microchip.com/downloads/en/DeviceDoc/mic5353.pdf
pins: 1 EN, 2 GND, 3 VIN, 4 VOUT, 5 NC hidden, 6 BYP, 7 GND hidden

## MIC5353-3.0YMT
designator *  value MIC5353-3.0YMT  Reference: U
ki_keywords: Single LDO; ki_description: High-performance, single-output,  ultra-low  LDO regulator; ki_fp_filters: MLF?6?1EP*1.6x1.6mm*P0.5mm*; Footprint: Package_DFN_QFN:MLF-6-1EP_1.6x1.6mm_P0.5mm_EP0.5x1.26mm; Datasheet: http://ww1.microchip.com/downloads/en/DeviceDoc/mic5353.pdf
pins: 1 EN, 2 GND, 3 VIN, 4 VOUT, 5 NC hidden, 6 BYP, 7 GND hidden

## MIC5353-3.3YMT
designator *  value MIC5353-3.3YMT  Reference: U
ki_keywords: Single LDO; ki_description: High-performance, single-output,  ultra-low  LDO regulator; ki_fp_filters: MLF?6?1EP*1.6x1.6mm*P0.5mm*; Footprint: Package_DFN_QFN:MLF-6-1EP_1.6x1.6mm_P0.5mm_EP0.5x1.26mm; Datasheet: http://ww1.microchip.com/downloads/en/DeviceDoc/mic5353.pdf
pins: 1 EN, 2 GND, 3 VIN, 4 VOUT, 5 NC hidden, 6 BYP, 7 GND hidden

## MIC5353YMT
designator *  value MIC5353YMT  Reference: U
ki_keywords: Single LDO; ki_description: High-performance, single-output,  ultra-low  LDO regulator; ki_fp_filters: MLF?6?1EP*1.6x1.6mm*P0.5mm*; Footprint: Package_DFN_QFN:MLF-6-1EP_1.6x1.6mm_P0.5mm_EP0.5x1.26mm; Datasheet: http://ww1.microchip.com/downloads/en/DeviceDoc/mic5353.pdf
pins: 1 EN, 2 GND, 3 VIN, 4 VOUT, 5 ADJ, 6 BYP, 7 GND hidden

## MIC5355-G4YMME
designator *  value MIC5355-G4YMME  Reference: U
ki_keywords: Dual LDO 500mA MSOP-8; ki_description: Dual 500mA μCap Low Dropout Micropower Linear Regulator, 1.8V/1.2V, MSOP-8; ki_fp_filters: MSOP*1EP*3x3mm*P0.65mm*; Footprint: Package_SO:MSOP-8-1EP_3x3mm_P0.65mm_EP2.5x3mm_Mask1.73x2.36mm_ThermalVias; Datasheet: http://ww1.microchip.com/downloads/en/DeviceDoc/mic5355_6.pdf
pins: 1 VIN, 2 GND, 3 NC hidden, 4 EN2, 5 EN1, 6 NC hidden, 7 VOUT2, 8 VOUT1, 9 GND hidden

## MIC5355-JGYMME
designator *  value MIC5355-JGYMME  Reference: U
ki_keywords: Dual LDO 500mA MSOP-8; ki_description: Dual 500mA μCap Low Dropout Micropower Linear Regulator, 2.5V/1.8V, MSOP-8; ki_fp_filters: MSOP*1EP*3x3mm*P0.65mm*; Footprint: Package_SO:MSOP-8-1EP_3x3mm_P0.65mm_EP2.5x3mm_Mask1.73x2.36mm_ThermalVias; Datasheet: http://ww1.microchip.com/downloads/en/DeviceDoc/mic5355_6.pdf
pins: 1 VIN, 2 GND, 3 NC hidden, 4 EN2, 5 EN1, 6 NC hidden, 7 VOUT2, 8 VOUT1, 9 GND hidden

## MIC5355-S4YMME
designator *  value MIC5355-S4YMME  Reference: U
ki_keywords: Dual LDO 500mA MSOP-8; ki_description: Dual 500mA μCap Low Dropout Micropower Linear Regulator, 3.3V/1.2V, MSOP-8; ki_fp_filters: MSOP*1EP*3x3mm*P0.65mm*; Footprint: Package_SO:MSOP-8-1EP_3x3mm_P0.65mm_EP2.5x3mm_Mask1.73x2.36mm_ThermalVias; Datasheet: http://ww1.microchip.com/downloads/en/DeviceDoc/mic5355_6.pdf
pins: 1 VIN, 2 GND, 3 NC hidden, 4 EN2, 5 EN1, 6 NC hidden, 7 VOUT2, 8 VOUT1, 9 GND hidden

## MIC5355-SCYMME
designator *  value MIC5355-SCYMME  Reference: U
ki_keywords: Dual LDO 500mA MSOP-8; ki_description: Dual 500mA μCap Low Dropout Micropower Linear Regulator, 3.3V/1.0V, MSOP-8; ki_fp_filters: MSOP*1EP*3x3mm*P0.65mm*; Footprint: Package_SO:MSOP-8-1EP_3x3mm_P0.65mm_EP2.5x3mm_Mask1.73x2.36mm_ThermalVias; Datasheet: http://ww1.microchip.com/downloads/en/DeviceDoc/mic5355_6.pdf
pins: 1 VIN, 2 GND, 3 NC hidden, 4 EN2, 5 EN1, 6 NC hidden, 7 VOUT2, 8 VOUT1, 9 GND hidden

## MIC5355-SGYMME
designator *  value MIC5355-SGYMME  Reference: U
ki_keywords: Dual LDO 500mA MSOP-8; ki_description: Dual 500mA μCap Low Dropout Micropower Linear Regulator, 3.3V/1.8V, MSOP-8; ki_fp_filters: MSOP*1EP*3x3mm*P0.65mm*; Footprint: Package_SO:MSOP-8-1EP_3x3mm_P0.65mm_EP2.5x3mm_Mask1.73x2.36mm_ThermalVias; Datasheet: http://ww1.microchip.com/downloads/en/DeviceDoc/mic5355_6.pdf
pins: 1 VIN, 2 GND, 3 NC hidden, 4 EN2, 5 EN1, 6 NC hidden, 7 VOUT2, 8 VOUT1, 9 GND hidden

## MIC5356-G4YMME
designator *  value MIC5356-G4YMME  Reference: U
ki_keywords: Dual LDO 500mA MSOP-8; ki_description: Dual 500mA μCap Low Dropout Micropower Linear Regulator, 1.8V/1.2V, MSOP-8; ki_fp_filters: MSOP*1EP*3x3mm*P0.65mm*; Footprint: Package_SO:MSOP-8-1EP_3x3mm_P0.65mm_EP2.5x3mm_Mask1.73x2.36mm_ThermalVias; Datasheet: http://ww1.microchip.com/downloads/en/DeviceDoc/mic5355_6.pdf
pins: 1 VIN, 2 GND, 3 NC hidden, 4 EN2, 5 EN1, 6 NC hidden, 7 VOUT2, 8 VOUT1, 9 GND hidden

## MIC5356-JGYMME
designator *  value MIC5356-JGYMME  Reference: U
ki_keywords: Dual LDO 500mA MSOP-8; ki_description: Dual 500mA μCap Low Dropout Micropower Linear Regulator, 2.5V/1.8V, MSOP-8; ki_fp_filters: MSOP*1EP*3x3mm*P0.65mm*; Footprint: Package_SO:MSOP-8-1EP_3x3mm_P0.65mm_EP2.5x3mm_Mask1.73x2.36mm_ThermalVias; Datasheet: http://ww1.microchip.com/downloads/en/DeviceDoc/mic5355_6.pdf
pins: 1 VIN, 2 GND, 3 NC hidden, 4 EN2, 5 EN1, 6 NC hidden, 7 VOUT2, 8 VOUT1, 9 GND hidden

## MIC5356-MGYML
designator *  value MIC5356-MGYML  Reference: U
ki_keywords: Dual LDO 500mA DFN-8; ki_description: Dual 500mA μCap Low Dropout Micropower Linear Regulator, 2.8V/1.8V, DFN-8; ki_fp_filters: MLF*1EP*3x3mm*P0.65mm*; Footprint: Package_DFN_QFN:MLF-8-1EP_3x3mm_P0.65mm_EP1.55x2.3mm_ThermalVias; Datasheet: http://ww1.microchip.com/downloads/en/DeviceDoc/mic5355_6.pdf
pins: 1 VIN, 2 GND, 3 NC hidden, 4 EN2, 5 EN1, 6 NC hidden, 7 VOUT2, 8 VOUT1, 9 GND hidden

## MIC5356-MMYML
designator *  value MIC5356-MMYML  Reference: U
ki_keywords: Dual LDO 500mA DFN-8; ki_description: Dual 500mA μCap Low Dropout Micropower Linear Regulator, 2.8V/2.8V, DFN-8; ki_fp_filters: MLF*1EP*3x3mm*P0.65mm*; Footprint: Package_DFN_QFN:MLF-8-1EP_3x3mm_P0.65mm_EP1.55x2.3mm_ThermalVias; Datasheet: http://ww1.microchip.com/downloads/en/DeviceDoc/mic5355_6.pdf
pins: 1 VIN, 2 GND, 3 NC hidden, 4 EN2, 5 EN1, 6 NC hidden, 7 VOUT2, 8 VOUT1, 9 GND hidden

## MIC5356-S4YMME
designator *  value MIC5356-S4YMME  Reference: U
ki_keywords: Dual LDO 500mA MSOP-8; ki_description: Dual 500mA μCap Low Dropout Micropower Linear Regulator, 3.3V/1.2V, MSOP-8; ki_fp_filters: MSOP*1EP*3x3mm*P0.65mm*; Footprint: Package_SO:MSOP-8-1EP_3x3mm_P0.65mm_EP2.5x3mm_Mask1.73x2.36mm_ThermalVias; Datasheet: http://ww1.microchip.com/downloads/en/DeviceDoc/mic5355_6.pdf
pins: 1 VIN, 2 GND, 3 NC hidden, 4 EN2, 5 EN1, 6 NC hidden, 7 VOUT2, 8 VOUT1, 9 GND hidden

## MIC5356-SCYMME
designator *  value MIC5356-SCYMME  Reference: U
ki_keywords: Dual LDO 500mA MSOP-8; ki_description: Dual 500mA μCap Low Dropout Micropower Linear Regulator, 3.3V/1.0V, MSOP-8; ki_fp_filters: MSOP*1EP*3x3mm*P0.65mm*; Footprint: Package_SO:MSOP-8-1EP_3x3mm_P0.65mm_EP2.5x3mm_Mask1.73x2.36mm_ThermalVias; Datasheet: http://ww1.microchip.com/downloads/en/DeviceDoc/mic5355_6.pdf
pins: 1 VIN, 2 GND, 3 NC hidden, 4 EN2, 5 EN1, 6 NC hidden, 7 VOUT2, 8 VOUT1, 9 GND hidden

## MIC5356-SGYMME
designator *  value MIC5356-SGYMME  Reference: U
ki_keywords: Dual LDO 500mA MSOP-8; ki_description: Dual 500mA μCap Low Dropout Micropower Linear Regulator, 3.3V/1.8V, MSOP-8; ki_fp_filters: MSOP*1EP*3x3mm*P0.65mm*; Footprint: Package_SO:MSOP-8-1EP_3x3mm_P0.65mm_EP2.5x3mm_Mask1.73x2.36mm_ThermalVias; Datasheet: http://ww1.microchip.com/downloads/en/DeviceDoc/mic5355_6.pdf
pins: 1 VIN, 2 GND, 3 NC hidden, 4 EN2, 5 EN1, 6 NC hidden, 7 VOUT2, 8 VOUT1, 9 GND hidden

## MIC5365-3.3YC5
designator *  value MIC5365-3.3YC5  Reference: U
ki_keywords: Micrel LDO voltage regulator; ki_description: 150mA Low-dropout Voltage Regulator, Vout 3.3V, Vin up to 5.5V, SC-70-5; ki_fp_filters: SOT*353*SC*70*; Footprint: Package_TO_SOT_SMD:SOT-353_SC-70-5; Datasheet: http://ww1.microchip.com/downloads/en/DeviceDoc/mic5365.pdf
pins: 1 VIN, 2 GND, 3 EN, 4 NC hidden, 5 VOUT

## MIC5365-3.3YD5
designator *  value MIC5365-3.3YD5  Reference: U
ki_keywords: Micrel LDO voltage regulator; ki_description: 150mA Low-dropout Voltage Regulator, Vout 3.3V, Vin up to 5.5V, SOT-23-5; ki_fp_filters: SOT?23*; Footprint: Package_TO_SOT_SMD:SOT-23-5; Datasheet: http://ww1.microchip.com/downloads/en/DeviceDoc/mic5365.pdf
pins: 1 VIN, 2 GND, 3 EN, 4 NC hidden, 5 VOUT